# Altium footprint library TYCO THD.PcbLib: 146 footprints (part 6 of 11) (continued)
## TYCO_280612-2 [mm] "8 Positions, Pitch 3.96mm, Single Row Vertical Shrouded Header"
height 17
pads (8):
  round 2.1 hole 1.4: 1(-13.86,0) 2(-9.9,0) 3(-5.94,0) 4(-1.98,0) 5(1.98,0) 6(5.94,0) 7(9.9,0) 8(13.86,0)
Top Overlay:
  lines w0.2: -15,-4.775 -15,-0.896 ; -15,-3.775 -15.5,-3.775 -15.5,-4.775 15.5,-4.775 15.5,-3.775 15,-3.775 ; -15,-3.302 -12.725,-3.302 -12.725,-4.14 -11.049,-4.14 -11.049,-3.302 -8.763,-3.302 -8.763,-4.14 -7.087,-4.14 -7.087,-3.302 -4.801,-3.302 -4.801,-4.14 -3.124,-4.14 -3.124,-3.302 -0.838,-3.302 -0.838,-4.14 0.838,-4.14 0.838,-3.302 3.124,-3.302 3.124,-4.14 4.801,-4.14 4.801,-3.302 7.087,-3.302 7.087,-4.14 8.763,-4.14 8.763,-3.302 11.049,-3.302 11.049,-4.14 12.725,-4.14 12.725,-3.302 15,-3.302 ; -15,0.896 -15,4.14 ; -15,2.14 -15.5,2.14 -15.5,4.14 15.5,4.14 15.5,2.14 15,2.14 ; -15,3.268 15,3.268 ; -12.725,-3.632 -11.049,-3.632 ; -8.763,-3.632 -7.087,-3.632 ; -4.801,-3.632 -3.124,-3.632 ; -0.838,-3.632 0.838,-3.632 ; 3.124,-3.632 4.801,-3.632 ; 7.087,-3.632 8.763,-3.632 ; 11.049,-3.632 12.725,-3.632 ; 15,-4.775 15,-0.896 ; 15,0.896 15,4.14
  text "1" at -14.075,-6.55 h1.2
Mechanical 8:
  lines w0.1: -14.36,0 -13.86,0 ; -13.86,-0.5 -13.86,0 ; -13.86,0.5 -13.86,0 ; -13.36,0 -13.86,0 ; -10.4,0 -9.9,0 ; -9.9,-0.5 -9.9,0 ; -9.9,0.5 -9.9,0 ; -9.4,0 -9.9,0 ; -6.44,0 -5.94,0 ; -5.94,-0.5 -5.94,0 ; -5.94,0.5 -5.94,0 ; -5.44,0 -5.94,0 ; -2.48,0 -1.98,0 ; -1.98,-0.5 -1.98,0 ; -1.98,0.5 -1.98,0 ; -1.48,0 -1.98,0 ; -0.5,0 0,0 ; 0,-0.5 0,0 ; 0,0.5 0,0 ; 0.5,0 0,0 ; 1.48,0 1.98,0 ; 1.98,-0.5 1.98,0 ; 1.98,0.5 1.98,0 ; 2.48,0 1.98,0 ; 5.44,0 5.94,0 ; 5.94,-0.5 5.94,0 ; 5.94,0.5 5.94,0 ; 6.44,0 5.94,0 ; 9.4,0 9.9,0 ; 9.9,-0.5 9.9,0 ; 9.9,0.5 9.9,0 ; 10.4,0 9.9,0 ; 13.36,0 13.86,0 ; 13.86,-0.5 13.86,0 ; 13.86,0.5 13.86,0 ; 14.36,0 13.86,0
Mechanical 14:
  lines w0.1: -15,-4.775 -15,4.14 -15,3.268 15,3.268 15,4.14 15,-4.775 ; -15,-3.775 -15.5,-3.775 -15.5,-4.775 15.5,-4.775 15.5,-3.775 15,-3.775 ; -15,-3.302 -12.725,-3.302 -12.725,-4.14 -11.049,-4.14 -11.049,-3.302 -8.763,-3.302 -8.763,-4.14 -7.087,-4.14 -7.087,-3.302 -4.801,-3.302 -4.801,-4.14 -3.124,-4.14 -3.124,-3.302 -0.838,-3.302 -0.838,-4.14 0.838,-4.14 0.838,-3.302 3.124,-3.302 3.124,-4.14 4.801,-4.14 4.801,-3.302 7.087,-3.302 7.087,-4.14 8.763,-4.14 8.763,-3.302 11.049,-3.302 11.049,-4.14 12.725,-4.14 12.725,-3.302 15,-3.302 ; -15,2.14 -15.5,2.14 -15.5,4.14 15.5,4.14 15.5,2.14 15,2.14 ; -12.725,-3.632 -11.049,-3.632 ; -8.763,-3.632 -7.087,-3.632 ; -4.801,-3.632 -3.124,-3.632 ; -0.838,-3.632 0.838,-3.632 ; 3.124,-3.632 4.801,-3.632 ; 7.087,-3.632 8.763,-3.632 ; 11.049,-3.632 12.725,-3.632 ; -14.254,-0.787 -14.254,0.787 -13.466,0.787 -13.466,-0.787 -14.254,-0.787 ; -10.294,-0.787 -10.294,0.787 -9.506,0.787 -9.506,-0.787 -10.294,-0.787 ; -6.334,-0.787 -6.334,0.787 -5.546,0.787 -5.546,-0.787 -6.334,-0.787 ; -2.374,-0.787 -2.374,0.787 -1.586,0.787 -1.586,-0.787 -2.374,-0.787 ; 1.586,-0.787 1.586,0.787 2.374,0.787 2.374,-0.787 1.586,-0.787 ; 5.546,-0.787 5.546,0.787 6.334,0.787 6.334,-0.787 5.546,-0.787 ; 9.506,-0.787 9.506,0.787 10.294,0.787 10.294,-0.787 9.506,-0.787 ; 13.466,-0.787 13.466,0.787 14.254,0.787 14.254,-0.787 13.466,-0.787
  text "1" at -14.095,-2.8 h1.2
  text "8" at 13.468,-2.8 h1.2
3D body "TYCO_280612-2.stp": height 17.02, standoff -3.3, extent -15.5,-4.775 15.5,4.14

## TYCO_282836-4 [mm] "15.5A, 300V, Terminal Block, Pitch 5mm, 4 Positions, Screw Connection"
height 10
pads (4):
  round 1.9 hole 1.2: 1(-7.5,0) 2(-2.5,0) 3(2.5,0) 4(7.5,0)
Top Overlay:
  circle w0.2: c7.5,0 r1.75
  circle w0.2: c2.5,0 r1.75
  circle w0.2: c-2.5,0 r1.75
  circle w0.2: c-7.5,0 r1.75
  lines w0.2: -10,-3.4 10,-3.4 ; -10,-3.3 -10.6,-3.5 -10.6,-2.6 -10,-2.8 ; -10,-2.6 10,-2.6 ; -9.215,-0.35 -8.752,-0.35 ; -9.215,0.35 -8.752,0.35 ; -8.4,4.1 -8.4,3.4 -6.6,3.4 -6.6,4.1 ; -6.248,-0.35 -5.785,-0.35 ; -6.248,0.35 -5.785,0.35 ; -3.96,-0.965 -3.633,-0.638 ; -3.465,-1.46 -3.138,-1.133 ; -3.4,4.1 -3.4,3.4 -1.6,3.4 -1.6,4.1 ; -1.862,1.133 -1.535,1.46 ; -1.367,0.638 -1.04,0.965 ; 1.04,0.965 1.367,0.638 ; 1.535,1.46 1.862,1.133 ; 1.6,4.1 1.6,3.4 3.4,3.4 3.4,4.1 ; 3.138,-1.133 3.465,-1.46 ; 3.633,-0.638 3.96,-0.965 ; 6.04,-0.965 6.367,-0.638 ; 6.535,-1.46 6.862,-1.133 ; 6.6,4.1 6.6,3.4 8.4,3.4 8.4,4.059 ; 8.138,1.133 8.465,1.46 ; 8.633,0.638 8.96,0.965 ; -10,-4.1 -10,4.1 10,4.1 10,-4.1 -10,-4.1
  text "1" at -7.75,-5.925 h1.2
Mechanical 8:
  lines w0.1: -8,0 -7.5,0 ; -7.5,-0.5 -7.5,0 ; -7.5,0.5 -7.5,0 ; -7,0 -7.5,0 ; -3,0 -2.5,0 ; -2.5,-0.5 -2.5,0 ; -2.5,0.5 -2.5,0 ; -2,0 -2.5,0 ; -0.5,0 0,0 ; 0,-0.5 0,0 ; 0,0.5 0,0 ; 0.5,0 0,0 ; 2,0 2.5,0 ; 2.5,-0.5 2.5,0 ; 2.5,0.5 2.5,0 ; 3,0 2.5,0 ; 7,0 7.5,0 ; 7.5,-0.5 7.5,0 ; 7.5,0.5 7.5,0 ; 8,0 7.5,0
Mechanical 14:
  circle w0.1: c7.5,0 r1.75
  circle w0.1: c2.5,0 r1.75
  circle w0.1: c-2.5,0 r1.75
  circle w0.1: c-7.5,0 r1.75
  lines w0.1: -10,-3.4 10,-3.4 ; -10,-3.3 -10.6,-3.5 -10.6,-2.6 -10,-2.8 ; -10,-2.6 10,-2.6 ; -9.215,-0.35 -5.785,-0.35 ; -9.215,0.35 -5.785,0.35 ; -8.4,4.1 -8.4,3.4 -6.6,3.4 -6.6,4.1 ; -3.96,-0.965 -1.535,1.46 ; -3.465,-1.46 -1.04,0.965 ; -3.4,4.1 -3.4,3.4 -1.6,3.4 -1.6,4.1 ; 1.04,0.965 3.465,-1.46 ; 1.535,1.46 3.96,-0.965 ; 1.6,4.1 1.6,3.4 3.4,3.4 3.4,4.1 ; 6.04,-0.965 8.465,1.46 ; 6.535,-1.46 8.96,0.965 ; 6.6,4.1 6.6,3.4 8.4,3.4 8.4,4.059 ; -10,-4.1 -10,4.1 10,4.1 10,-4.1 -10,-4.1
  text "1" at -9.45,1.675 h1.2
3D body "TYCO_282836-4.stp": height 10, standoff -3.5, extent -10.6,-4.1 10,4.1

## TYCO_284516-3 [mm] "3 Positions, Pitch 3.5mm, Straight Header with Threaded Flange"
height 9.4
pads (3):
  round 1.9 hole 1.2: 1(-3.5,0) 2(0,0) 3(3.5,0)
Top Overlay:
  circle w0.2: c-7.8,0 r1.5
  circle w0.2: c-7.8,0 r1.3
  circle w0.2: c7.8,0 r1.3
  circle w0.2: c7.8,0 r1.5
  lines w0.2: -10.4,-3 10.4,-3 10.4,4.25 -10.4,4.25 -10.4,-3 ; -5.05,-2.25 -5.05,2.05 -4.4,2.05 ccw(c-4.4,2.25) -4.2,2.25 -4.2,2.5 ccw(c-4.4,2.5) -4.4,2.7 -4.75,2.7 -4.75,3.35 -2.25,3.35 -2.25,2.7 -2.6,2.7 ccw(c-2.6,2.5) -2.8,2.5 -2.8,2.25 ccw(c-2.6,2.25) -2.6,2.05 -1.95,2.05 -1.95,-2.25 -2.583,-2.25 ccw(c-3.5,-3.5) -4.417,-2.25 -5.05,-2.25 ; -1.55,-2.25 -1.55,2.05 -0.9,2.05 ccw(c-0.9,2.25) -0.7,2.25 -0.7,2.5 ccw(c-0.9,2.5) -0.9,2.7 -1.25,2.7 -1.25,3.35 1.25,3.35 1.25,2.7 0.9,2.7 ccw(c0.9,2.5) 0.7,2.5 0.7,2.25 ccw(c0.9,2.25) 0.9,2.05 1.55,2.05 1.55,-2.25 0.917,-2.25 ccw(c0,-3.5) -0.917,-2.25 -1.55,-2.25 ; 1.95,-2.25 1.95,2.05 2.6,2.05 ccw(c2.6,2.25) 2.8,2.25 2.8,2.5 ccw(c2.6,2.5) 2.6,2.7 2.25,2.7 2.25,3.35 4.75,3.35 4.75,2.7 4.4,2.7 ccw(c4.4,2.5) 4.2,2.5 4.2,2.25 ccw(c4.4,2.25) 4.4,2.05 5.05,2.05 5.05,-2.25 4.417,-2.25 ccw(c3.5,-3.5) 2.583,-2.25 1.95,-2.25
  text "1" at -3.63,-4.935 h1.2
Mechanical 8:
  lines w0.1: -4,0 -3.5,0 ; -3.5,-0.5 -3.5,0 ; -3.5,0.5 -3.5,0 ; -3,0 -3.5,0 ; -0.5,0 0,0 ; 0,-0.5 0,0 ; 0,0.5 0,0 ; 0.5,0 0,0 ; 3,0 3.5,0 ; 3.5,-0.5 3.5,0 ; 3.5,0.5 3.5,0 ; 4,0 3.5,0
Mechanical 14:
  circle w0.1: c-3.5,0 r1.1
  circle w0.1: c-3.5,0 r0.9
  circle w0.1: c0,0 r1.1
  circle w0.1: c0,0 r0.9
  circle w0.1: c3.5,0 r1.1
  circle w0.1: c3.5,0 r0.9
  circle w0.1: c-7.8,0 r1.5
  circle w0.1: c-7.8,0 r1.3
  circle w0.1: c7.8,0 r1.3
  circle w0.1: c7.8,0 r1.5
  lines w0.1: -10.4,-3 10.4,-3 10.4,4.25 -10.4,4.25 -10.4,-3 ; -5.05,-2.25 -5.05,2.05 -4.4,2.05 ccw(c-4.4,2.25) -4.2,2.25 -4.2,2.5 ccw(c-4.4,2.5) -4.4,2.7 -4.75,2.7 -4.75,3.35 -2.25,3.35 -2.25,2.7 -2.6,2.7 ccw(c-2.6,2.5) -2.8,2.5 -2.8,2.25 ccw(c-2.6,2.25) -2.6,2.05 -1.95,2.05 -1.95,-2.25 -2.583,-2.25 ccw(c-3.5,-3.5) -4.417,-2.25 -5.05,-2.25 ; -3.9,-0.4 -3.1,-0.4 -3.1,0.4 -3.9,0.4 -3.9,-0.4 ; -1.55,-2.25 -1.55,2.05 -0.9,2.05 ccw(c-0.9,2.25) -0.7,2.25 -0.7,2.5 ccw(c-0.9,2.5) -0.9,2.7 -1.25,2.7 -1.25,3.35 1.25,3.35 1.25,2.7 0.9,2.7 ccw(c0.9,2.5) 0.7,2.5 0.7,2.25 ccw(c0.9,2.25) 0.9,2.05 1.55,2.05 1.55,-2.25 0.917,-2.25 ccw(c0,-3.5) -0.917,-2.25 -1.55,-2.25 ; -0.4,-0.4 0.4,-0.4 0.4,0.4 -0.4,0.4 -0.4,-0.4 ; 1.95,-2.25 1.95,2.05 2.6,2.05 ccw(c2.6,2.25) 2.8,2.25 2.8,2.5 ccw(c2.6,2.5) 2.6,2.7 2.25,2.7 2.25,3.35 4.75,3.35 4.75,2.7 4.4,2.7 ccw(c4.4,2.5) 4.2,2.5 4.2,2.25 ccw(c4.4,2.25) 4.4,2.05 5.05,2.05 5.05,-2.25 4.417,-2.25 ccw(c3.5,-3.5) 2.583,-2.25 1.95,-2.25 ; 3.1,-0.4 3.9,-0.4 3.9,0.4 3.1,0.4 3.1,-0.4
  text "1" at -3.63,-4.935 h1.2
3D body "TYCO_284516-3.stp": height 9.2, standoff -3.4, extent -10.4,-3 10.4,4.25

## TYCO_284516-8 [mm] "8 Positions, Pitch 3.5mm, Straight Header with Threaded Flange"
height 9.4
pads (8):
  round 1.9 hole 1.2: 1(-12.25,0) 2(-8.75,0) 3(-5.25,0) 4(-1.75,0) 5(1.75,0) 6(5.25,0) 7(8.75,0) 8(12.25,0)
Top Overlay:
  drawing of 152 lines, arcs and shapes, not listed
  text "1" at -12.38,-4.935 h1.2
Mechanical 8:
  lines w0.1: -12.75,0 -12.25,0 ; -12.25,-0.5 -12.25,0 ; -12.25,0.5 -12.25,0 ; -11.75,0 -12.25,0 ; -9.25,0 -8.75,0 ; -8.75,-0.5 -8.75,0 ; -8.75,0.5 -8.75,0 ; -8.25,0 -8.75,0 ; -5.75,0 -5.25,0 ; -5.25,-0.5 -5.25,0 ; -5.25,0.5 -5.25,0 ; -4.75,0 -5.25,0 ; -2.25,0 -1.75,0 ; -1.75,-0.5 -1.75,0 ; -1.75,0.5 -1.75,0 ; -1.25,0 -1.75,0 ; -0.5,0 0,0 ; 0,-0.5 0,0 ; 0,0.5 0,0 ; 0.5,0 0,0 ; 1.25,0 1.75,0 ; 1.75,-0.5 1.75,0 ; 1.75,0.5 1.75,0 ; 2.25,0 1.75,0 ; 4.75,0 5.25,0 ; 5.25,-0.5 5.25,0 ; 5.25,0.5 5.25,0 ; 5.75,0 5.25,0 ; 8.25,0 8.75,0 ; 8.75,-0.5 8.75,0 ; 8.75,0.5 8.75,0 ; 9.25,0 8.75,0 ; 11.75,0 12.25,0 ; 12.25,-0.5 12.25,0 ; 12.25,0.5 12.25,0 ; 12.75,0 12.25,0
Mechanical 14:
  drawing of 200 lines, arcs and shapes, not listed
3D body "TYCO_284516-8.stp": height 9.2, standoff -3.4, extent -19.15,-3 19.15,4.25

## TYCO_292303-1 [mm] "4 Positions, Right Angle, USB Type A Receptacle"
height 7.65
pads (6):
  round 1.6 hole 0.9: 1(-3.5,0) 2(-1,0) 3(1,0) 4(3.5,0)
  round 3 hole 2.3: 5(-6.57,-2.71) 5(6.57,-2.71)
Top Overlay:
  lines w0.2: -6.565,-4.71 -6.565,-12.37 ; -6.565,-0.71 -6.565,1.01 -4.318,1.01 ; -6.247,-12.37 cw(c-6.867,-12.37) -6.867,-12.99 -7.312,-12.99 -7.312,-12.672 -6.867,-12.672 ccw(c-6.867,-12.37) -6.565,-12.37 ; -5.607,-12.672 5.607,-12.672 ; -5.607,-12.37 -5.607,-12.99 5.607,-12.99 5.607,-12.37 ; -3.846,-11.624 -2.154,-11.624 ; -3.422,-11.196 -2.578,-11.196 ; 2.154,-11.624 3.846,-11.624 ; 2.578,-11.196 3.422,-11.196 ; 4.318,1.01 6.565,1.01 6.565,-0.71 ; 6.247,-12.37 ccw(c6.867,-12.37) 6.867,-12.99 7.312,-12.99 7.312,-12.672 6.867,-12.672 cw(c6.867,-12.37) 6.565,-12.37 ; 6.565,-4.71 6.565,-12.37 ; -6.565,-12.37 6.565,-12.37 ; -4.745,-5.082 cw(c-4.497,-5.048) -4.249,-5.015 -3.392,-11.421 -2.608,-11.421 -1.751,-5.015 cw(c-1.503,-5.048) -1.255,-5.082 -2.104,-11.426 cw(c-3,-11.306) -3.896,-11.426 -4.745,-5.082 ; 1.255,-5.082 cw(c1.503,-5.048) 1.751,-5.015 2.608,-11.421 3.392,-11.421 4.249,-5.015 cw(c4.497,-5.048) 4.745,-5.082 3.896,-11.426 cw(c3,-11.306) 2.104,-11.426 1.255,-5.082
Mechanical 8:
  circle w0.1: c-6.57,-2.71 r1.5
  circle w0.1: c6.565,-2.71 r1.5
  circle w0.1: c-1,0 r0.8
  circle w0.1: c1,0 r0.8
  circle w0.1: c3.5,0 r0.8
  circle w0.1: c-3.5,0 r0.8
  circle w0.1: c3.5,0 r0.45
  circle w0.1: c1,0 r0.45
  circle w0.1: c-1,0 r0.45
  circle w0.1: c-3.5,0 r0.45
  circle w0.1: c6.57,-2.71 r1.15
  circle w0.1: c-6.57,-2.71 r1.15
  lines w0.1: -7.07,-2.71 -6.57,-2.71 ; -6.57,-3.21 -6.57,-2.71 ; -6.57,-2.21 -6.57,-2.71 ; -6.07,-2.71 -6.57,-2.71 ; -4,0 -3.5,0 ; -3.5,-0.5 -3.5,0 ; -3.5,0.5 -3.5,0 ; -3,0 -3.5,0 ; -1.5,0 -1,0 ; -1,-0.5 -1,0 ; -1,0.5 -1,0 ; -0.5,0 -1,0 ; -0.354,-0.354 0,0 ; -0.354,0.354 0,0 ; 0.354,-0.354 0,0 ; 0.354,0.354 0,0 ; 0.5,0 1,0 ; 1,-0.5 1,0 ; 1,0.5 1,0 ; 1.5,0 1,0 ; 3,0 3.5,0 ; 3.5,-0.5 3.5,0 ; 3.5,0.5 3.5,0 ; 4,0 3.5,0 ; 6.07,-2.71 6.57,-2.71 ; 6.57,-3.21 6.57,-2.71 ; 6.57,-2.21 6.57,-2.71 ; 7.07,-2.71 6.57,-2.71
Mechanical 14:
  lines w0.1: -6.565,-3.75 ccw(c-6.665,-3.75) -6.649,-3.652 -8.033,-3.427 cw(c-8.017,-3.328) -8.117,-3.328 -8.117,-2.092 cw(c-8.017,-2.092) -8.033,-1.993 -6.649,-1.768 ccw(c-6.665,-1.67) -6.565,-1.67 ; -6.565,-1.364 -6.68,-1.11 -6.68,-0.61 -6.565,-0.61 ; -6.247,-12.37 cw(c-6.867,-12.37) -6.867,-12.99 -7.312,-12.99 -7.312,-12.672 -6.867,-12.672 ccw(c-6.867,-12.37) -6.565,-12.37 ; -5.607,-12.672 5.607,-12.672 ; -5.607,-12.37 -5.607,-12.99 5.607,-12.99 5.607,-12.37 ; -3.846,-11.624 -2.154,-11.624 ; -3.422,-11.196 -2.578,-11.196 ; 2.154,-11.624 3.846,-11.624 ; 2.578,-11.196 3.422,-11.196 ; 6.247,-12.37 ccw(c6.867,-12.37) 6.867,-12.99 7.312,-12.99 7.312,-12.672 6.867,-12.672 cw(c6.867,-12.37) 6.565,-12.37 ; 6.565,-3.75 cw(c6.665,-3.75) 6.649,-3.652 8.033,-3.427 ccw(c8.017,-3.328) 8.117,-3.328 8.117,-2.092 ccw(c8.017,-2.092) 8.033,-1.993 6.649,-1.768 cw(c6.665,-1.67) 6.565,-1.67 ; 6.565,-1.364 6.68,-1.11 6.68,-0.61 6.565,-0.61 ; -6.565,-12.37 6.565,-12.37 ; -6.565,-12.37 -6.565,1.01 6.565,1.01 6.565,-12.37 ; -4.745,-5.082 cw(c-4.497,-5.048) -4.249,-5.015 -3.392,-11.421 -2.608,-11.421 -1.751,-5.015 cw(c-1.503,-5.048) -1.255,-5.082 -2.104,-11.426 cw(c-3,-11.306) -3.896,-11.426 -4.745,-5.082 ; 1.255,-5.082 cw(c1.503,-5.048) 1.751,-5.015 2.608,-11.421 3.392,-11.421 4.249,-5.015 cw(c4.497,-5.048) 4.745,-5.082 3.896,-11.426 cw(c3,-11.306) 2.104,-11.426 1.255,-5.082
3D body "TYCO_292303-1.stp": height 7.66, standoff -3.61, extent -8.115,-12.99 8.117,1.01

## TYCO_292304-1 [mm] "Thru Hole, Right Angle, 4 Position, Type B, USB Receptacle"
height 11.5
pads (6):
  round 1.7 hole 1: 1(1.25,1) 2(-1.25,1) 3(-1.25,-1) 4(1.25,-1)
  round 3 hole 2.3: 5(-6.02,-3.71) 5(6.02,-3.71)
Top Overlay:
  circle w0.3: c1.257,2.427 r0.15
  lines w0.2: -6.13,-1.913 -6.13,1.72 -2.147,1.72 ; -6.018,-5.51 -6.018,-13.98 6.018,-13.98 6.018,-5.51 ; -5.6,-1.96 -5.6,1.72 ; -4.544,-2.68 4.544,-2.68 ; -1.25,-13.98 -1.25,-12.832 cw(c-1,-12.83) -0.75,-12.832 -0.75,-13.98 ; -1.25,-13.662 -0.75,-13.662 ; -1.25,-13.568 -0.75,-13.568 ; -0.75,-13.342 0.75,-13.342 ; 0.75,-13.98 0.75,-12.832 cw(c1,-12.83) 1.25,-12.832 1.25,-13.98 ; 0.75,-13.662 1.25,-13.662 ; 0.75,-13.568 1.25,-13.568 ; 2.147,1.72 6.13,1.72 6.13,-1.913 ; 5.6,-1.96 5.6,1.72
Mechanical 8:
  lines w0.1: -7.02,-3.71 -6.02,-3.71 ; -6.02,-4.71 -6.02,-3.71 ; -6.02,-2.71 -6.02,-3.71 ; -5.02,-3.71 -6.02,-3.71 ; -2.25,-1 -1.25,-1 ; -2.25,1 -1.25,1 ; -1.25,-2 -1.25,-1 ; -1.25,2 -1.25,1 ; -1,0 0,0 ; -0.25,-1 -1.25,-1 ; -0.25,1 -1.25,1 ; 0,-1 0,0 ; 0,1 0,0 ; 0.25,-1 1.25,-1 ; 0.25,1 1.25,1 ; 1,0 0,0 ; 1.25,-2 1.25,-1 ; 1.25,2 1.25,1 ; 2.25,-1 1.25,-1 ; 2.25,1 1.25,1 ; 5.02,-3.71 6.02,-3.71 ; -1.25,-1 -1.25,0 -1.25,1 ; 1.25,-1 1.25,0 1.25,1 ; 6.02,-4.71 6.02,-3.71 ; 6.02,-4.71 6.02,-3.71 ; 6.02,-4.71 6.02,-3.71 ; 6.02,-3.71 6.02,-2.71 ; 6.02,-3.71 7.02,-3.71 ; 6.02,-3.71 6.02,-2.71 ; 6.02,-3.71 7.02,-3.71 ; 6.02,-3.71 6.02,-2.71 ; 6.02,-3.71 7.02,-3.71
Mechanical 14:
  lines w0.1: -6.13,-4.608 -6.13,-4.81 -6.018,-5.057 ; -6.018,-4.619 -7.096,-4.511 ; -6.018,-2.781 -7.096,-2.889 ; -5.6,-2.68 -5.6,1.72 ; -5.6,-2.28 -6.13,-2.28 -6.13,1.72 6.13,1.72 6.13,-2.28 5.6,-2.28 ; -1.25,-13.98 -1.25,-12.832 cw(c-1,-12.83) -0.75,-12.832 -0.75,-13.98 ; -1.25,-13.662 -0.75,-13.662 ; -1.25,-13.568 -0.75,-13.568 ; -0.75,-13.342 0.75,-13.342 ; 0.75,-13.98 0.75,-12.832 cw(c1,-12.83) 1.25,-12.832 1.25,-13.98 ; 0.75,-13.662 1.25,-13.662 ; 0.75,-13.568 1.25,-13.568 ; 5.6,-2.68 5.6,1.72 ; 6.018,-5.057 6.13,-4.81 6.13,-4.608 ; 6.018,-4.619 7.096,-4.511 ; 6.018,-2.781 7.096,-2.889 ; -7.096,-4.511 -7.096,-2.889 ; -7.096,-4.511 -7.162,-4.5 -7.192,-4.486 -7.195,-4.479 -7.195,-2.921 -7.192,-2.914 -7.162,-2.9 -7.096,-2.889 ; 7.096,-4.511 7.096,-2.889 ; 7.096,-4.511 7.162,-4.5 7.192,-4.486 7.195,-4.479 7.195,-2.921 7.192,-2.914 7.162,-2.9 7.096,-2.889 ; -6.018,-13.98 -6.018,-2.68 6.018,-2.68 6.018,-13.98 -6.018,-13.98
3D body "TYCO_292304-1.stp": height 11.5, standoff -3.93, extent -7.194,-13.98 7.195,1.72

## TYCO_350209-1 [mm] "2 Circuits In-Line - 200\" Centerline, Commercial MATE-N-LOK Header"
height 10.29
pads (2):
  round 2.5 hole 1.8: 1(2.54,0) 2(-2.54,0)
Top Overlay:
  circle w0.2: c2.54,0 r1.587
  circle w0.2: c-2.54,0 r1.587
  lines w0.2: -6.541,-1.651 -7.62,-1.651 -7.62,1.651 -6.541,1.651 ; -5.683,-2.921 -6.541,-2.921 ccw(c-5.271,-2.921) -5.271,-4.191 -5.27,-3.143 ; -5.271,2.127 -5.271,4.191 ; -4.667,2.921 -6.541,2.921 ; -3.391,-3.143 -3.391,-2.813 -1.93,-2.813 -1.93,-3.143 ; -3.391,3.143 -3.391,2.813 -1.93,2.813 -1.93,3.143 ; -1.568,-4.191 -1.568,-5.461 -0.406,-5.461 -0.406,-4.191 ; 1.689,-3.143 1.689,-2.813 3.15,-2.813 3.15,-3.143 ; 1.689,3.143 1.689,2.813 3.15,2.813 3.15,3.143 ; 3.404,-4.191 3.404,-5.461 4.674,-5.461 4.674,-4.191 ; 4.667,2.921 6.541,2.921 ; 5.27,-3.143 5.271,-4.191 ; 5.271,2.127 5.271,4.191 ; 5.683,-2.921 6.541,-2.921 ; 6.541,-1.651 7.62,-1.651 7.62,1.651 6.541,1.651 ; -6.541,2.921 cw(c-5.271,2.921) -5.271,4.191 ; -6.541,2.921 -6.541,-5.461 -5.378,-5.461 -5.378,-4.191 5.271,-4.191 ; -5.271,4.191 5.271,4.191 ; 5.271,-4.191 ccw(c5.271,-2.921) 6.541,-2.921 ; 5.271,4.191 cw(c5.271,2.921) 6.541,2.921 ; 6.541,-2.921 6.541,2.921 ; -5.683,-3.143 5.683,-3.143 5.683,2.127 4.667,2.127 4.667,3.143 -4.667,3.143 -4.667,2.127 -5.683,2.127 -5.683,-3.143
  text "2" at -2.24,-5.525 h1.2
  text "1" at 2.79,-5.1 h1.2
Mechanical 8:
  lines w0.1: -1,0 0,0 ; 0,-1 0,0 ; 0,1 0,0 ; 1,0 0,0
Mechanical 14:
  circle w0.1: c2.54,0 r1.587
  circle w0.1: c-2.54,0 r1.587
  circle w0.1: c-2.54,0 r1.048
  circle w0.1: c2.54,0 r1.048
  lines w0.1: -6.541,-1.651 -7.62,-1.651 -7.62,1.651 -6.541,1.651 ; -5.683,-2.921 -6.541,-2.921 ccw(c-5.271,-2.921) -5.271,-4.191 -5.27,-3.143 ; -5.271,2.127 -5.271,4.191 ; -4.667,2.921 -6.541,2.921 ; -3.391,-3.143 -3.391,-2.813 -1.93,-2.813 -1.93,-3.143 ; -3.391,3.143 -3.391,2.813 -1.93,2.813 -1.93,3.143 ; -1.568,-4.191 -1.568,-5.461 -0.406,-5.461 -0.406,-4.191 ; 1.689,-3.143 1.689,-2.813 3.15,-2.813 3.15,-3.143 ; 1.689,3.143 1.689,2.813 3.15,2.813 3.15,3.143 ; 3.404,-4.191 3.404,-5.461 4.674,-5.461 4.674,-4.191 ; 4.667,2.921 6.541,2.921 ; 5.27,-3.143 5.271,-4.191 ; 5.271,2.127 5.271,4.191 ; 5.683,-2.921 6.541,-2.921 ; 6.541,-1.651 7.62,-1.651 7.62,1.651 6.541,1.651 ; -6.541,2.921 cw(c-5.271,2.921) -5.271,4.191 ; -6.541,2.921 -6.541,-5.461 -5.378,-5.461 -5.378,-4.191 5.271,-4.191 ; -5.271,4.191 5.271,4.191 ; 5.271,-4.191 ccw(c5.271,-2.921) 6.541,-2.921 ; 5.271,4.191 cw(c5.271,2.921) 6.541,2.921 ; 6.541,-2.921 6.541,2.921 ; -5.683,-3.143 5.683,-3.143 5.683,2.127 4.667,2.127 4.667,3.143 -4.667,3.143 -4.667,2.127 -5.683,2.127 -5.683,-3.143
  text "2" at -2.24,-5.525 h1.2
  text "1" at 2.79,-5.1 h1.2
3D body "TYCO_350209-1.stp": height 10.29, standoff -3.43, extent -7.62,-5.461 7.62,4.191

## TYCO_350211-1 [mm] "4 Circuits In-Line - 200\" Centerline, Commercial MATE-N-LOK Header"
height 10.29
pads (4):
  round 2.5 hole 1.8: 1(7.62,0) 2(2.54,0) 3(-2.54,0) 4(-7.62,0)
Top Overlay:
  circle w0.2: c-7.62,0 r1.587
  circle w0.2: c-2.54,0 r1.587
  circle w0.2: c2.54,0 r1.587
  circle w0.2: c7.62,0 r1.587
  lines w0.2: -11.652,-2.858 ccw(c-10.382,-2.858) -10.382,-4.128 ; -11.652,-1.651 -12.7,-1.651 -12.7,1.651 -11.652,1.651 ; -7.43,-3.207 -7.43,-2.826 -3.874,-2.826 -3.874,-3.207 ; -7.43,3.207 -7.43,2.826 -3.874,2.826 -3.874,3.207 ; -6.572,-4.128 -6.572,-5.398 -5.302,-5.398 -5.302,-4.128 ; -1.492,-4.128 -1.492,-5.398 -0.222,-5.398 -0.222,-4.128 ; 3.588,-4.128 3.588,-5.398 4.858,-5.398 4.858,-4.128 ; 3.797,-3.207 3.797,-2.826 7.353,-2.826 7.353,-3.207 ; 3.797,3.207 3.797,2.826 7.353,2.826 7.353,3.207 ; 7.537,-3.175 7.734,-3.175 ; 8.668,-4.128 8.668,-5.398 9.938,-5.398 9.938,-4.128 ; 11.652,-1.651 12.7,-1.651 12.7,1.651 11.652,1.651 ; -10.382,-4.128 -10.382,-5.398 -11.652,-5.398 -11.652,2.858 cw(c-10.382,2.858) -10.382,4.128 10.382,4.128 cw(c10.382,2.858) 11.652,2.858 11.652,-2.858 cw(c10.382,-2.858) 10.382,-4.128 -10.382,-4.128 ; -10.605,-3.207 -10.605,1.429 -8.827,3.207 8.827,3.207 10.605,1.429 10.605,-3.207 -10.605,-3.207
  text "4" at -7.715,-5.58 h1.2
  text "3" at -2.415,-5.53 h1.2
  text "2" at 2.775,-5.525 h1.2
  text "1" at 7.7,-5.275 h1.2
Mechanical 8:
  lines w0.1: -8.62,0 -7.62,0 ; -7.62,-1 -7.62,0 ; -7.62,1 -7.62,0 ; -6.62,0 -7.62,0 ; -3.54,0 -2.54,0 ; -2.54,-1 -2.54,0 ; -2.54,1 -2.54,0 ; -1.54,0 -2.54,0 ; -1,0 0,0 ; 0,-1 0,0 ; 0,1 0,0 ; 1,0 0,0 ; 1.54,0 2.54,0 ; 2.54,-1 2.54,0 ; 2.54,1 2.54,0 ; 3.54,0 2.54,0 ; 6.62,0 7.62,0 ; 7.62,-1 7.62,0 ; 7.62,1 7.62,0 ; 8.62,0 7.62,0
Mechanical 14:
  circle w0.1: c-7.62,0 r1.048
  circle w0.1: c-7.62,0 r1.587
  circle w0.1: c-2.54,0 r1.048
  circle w0.1: c-2.54,0 r1.587
  circle w0.1: c2.54,0 r1.048
  circle w0.1: c2.54,0 r1.587
  circle w0.1: c7.62,0 r1.048
  circle w0.1: c7.62,0 r1.587
  lines w0.1: -11.652,-2.858 ccw(c-10.382,-2.858) -10.382,-4.128 ; -11.652,-1.651 -12.7,-1.651 -12.7,1.651 -11.652,1.651 ; -7.43,-3.207 -7.43,-2.826 -3.874,-2.826 -3.874,-3.207 ; -7.43,3.207 -7.43,2.826 -3.874,2.826 -3.874,3.207 ; -6.572,-4.128 -6.572,-5.398 -5.302,-5.398 -5.302,-4.128 ; -1.492,-4.128 -1.492,-5.398 -0.222,-5.398 -0.222,-4.128 ; 3.588,-4.128 3.588,-5.398 4.858,-5.398 4.858,-4.128 ; 3.797,-3.207 3.797,-2.826 7.353,-2.826 7.353,-3.207 ; 3.797,3.207 3.797,2.826 7.353,2.826 7.353,3.207 ; 7.537,-3.175 7.734,-3.175 ; 8.668,-4.128 8.668,-5.398 9.938,-5.398 9.938,-4.128 ; 11.652,-1.651 12.7,-1.651 12.7,1.651 11.652,1.651 ; -10.382,-4.128 -10.382,-5.398 -11.652,-5.398 -11.652,2.858 cw(c-10.382,2.858) -10.382,4.128 10.382,4.128 cw(c10.382,2.858) 11.652,2.858 11.652,-2.858 cw(c10.382,-2.858) 10.382,-4.128 -10.382,-4.128 ; -10.605,-3.207 -10.605,1.429 -8.827,3.207 8.827,3.207 10.605,1.429 10.605,-3.207 -10.605,-3.207
  text "4" at -7.715,-5.58 h1.2
  text "3" at -2.415,-5.53 h1.2
  text "2" at 2.775,-5.525 h1.2
  text "1" at 7.7,-5.275 h1.2
3D body "TYCO_350211-1.stp": height 10.29, standoff -3.43, extent -12.7,-5.397 12.7,4.128

## TYCO_350582-1 [mm] "2 Circuits In-Line - Universal MATE-N-LOK Connector"
height 14.73
pads (2):
  round 2.5 hole 1.8: 1(-3.175,0) 2(3.175,0)
Top Overlay:
  lines w0.2: -7.325,-1.27 -7.325,1.27 ; -6.985,-3.81 6.985,-3.81 ; -5.715,-3.81 -5.715,-5.08 -6.985,-5.08 -6.985,-1.27 -9.525,-1.27 -9.525,1.27 -6.985,1.27 -6.985,3.81 6.985,3.81 6.985,1.27 9.525,1.27 9.525,-1.27 6.985,-1.27 6.985,-5.08 5.715,-5.08 5.715,-3.81 ; -0.635,-3.81 -0.635,-5.08 0.635,-5.08 0.635,-3.81 ; 7.325,-1.27 7.325,1.27 ; -5.998,-2.823 -5.998,0 ; -5.998,-2.823 -5.779,-2.604 ; -5.998,-2.823 -0.352,-2.823 ; -5.998,0 cw(c-3.175,0) -0.352,0 ; -5.998,0 -5.779,0 ; -5.779,-2.604 -5.779,0 ; -5.779,-2.604 -0.572,-2.604 ; -5.779,0 cw(c-3.175,0) -0.572,0 ; -0.572,-2.604 -0.352,-2.823 ; -0.572,-2.604 -0.572,0 ; -0.572,0 -0.352,0 ; -0.352,-2.823 -0.352,0 ; 0.352,-2.823 5.998,-2.823 ; 0.352,-2.823 0.352,0 ; 0.352,-2.823 0.572,-2.604 ; 0.352,0 cw(c3.175,0) 5.998,0 ; 0.352,0 0.572,0 ; 0.572,-2.604 5.779,-2.604 ; 0.572,-2.604 0.572,0 ; 0.572,0 cw(c3.175,0) 5.779,0 ; 5.779,-2.604 5.998,-2.823 ; 5.779,-2.604 5.779,0 ; 5.779,0 5.998,0 ; 5.998,-2.823 5.998,0
  text "2" at 3.762,-5.21 h1.2
  text "1" at -2.746,-4.783 h1.2
Mechanical 8:
  lines w0.1: -3.675,0 -3.175,0 ; -3.175,-0.5 -3.175,0 ; -3.175,0.5 -3.175,0 ; -2.675,0 -3.175,0 ; -0.5,0 0,0 ; 0,-0.5 0,0 ; 0,0.5 0,0 ; 0.5,0 0,0 ; 2.675,0 3.175,0 ; 3.175,-0.5 3.175,0 ; 3.175,0.5 3.175,0 ; 3.675,0 3.175,0
Mechanical 14:
  circle w0.1: c3.175,0 r0.965
  circle w0.1: c-3.175,0 r0.965
  lines w0.1: -7.325,-1.27 -7.325,1.27 ; -6.985,-3.81 6.985,-3.81 ; -5.715,-3.81 -5.715,-5.08 -6.985,-5.08 -6.985,-1.27 -9.525,-1.27 -9.525,1.27 -6.985,1.27 -6.985,3.81 6.985,3.81 6.985,1.27 9.525,1.27 9.525,-1.27 6.985,-1.27 6.985,-5.08 5.715,-5.08 5.715,-3.81 ; -4.12,-0.222 -2.23,-0.222 ; -4.12,0.222 -2.23,0.222 ; -0.635,-3.81 -0.635,-5.08 0.635,-5.08 0.635,-3.81 ; 2.23,-0.222 4.12,-0.222 ; 2.23,0.222 4.12,0.222 ; 7.325,-1.27 7.325,1.27 ; -5.998,-2.823 -5.998,0 ; -5.998,-2.823 -5.779,-2.604 ; -5.998,-2.823 -0.352,-2.823 ; -5.998,0 cw(c-3.175,0) -0.352,0 ; -5.998,0 -5.779,0 ; -5.779,-2.604 -5.779,0 ; -5.779,-2.604 -0.572,-2.604 ; -5.779,0 cw(c-3.175,0) -0.572,0 ; -0.572,-2.604 -0.352,-2.823 ; -0.572,-2.604 -0.572,0 ; -0.572,0 -0.352,0 ; -0.352,-2.823 -0.352,0 ; 0.352,-2.823 5.998,-2.823 ; 0.352,-2.823 0.352,0 ; 0.352,-2.823 0.572,-2.604 ; 0.352,0 cw(c3.175,0) 5.998,0 ; 0.352,0 0.572,0 ; 0.572,-2.604 5.779,-2.604 ; 0.572,-2.604 0.572,0 ; 0.572,0 cw(c3.175,0) 5.779,0 ; 5.779,-2.604 5.998,-2.823 ; 5.779,-2.604 5.779,0 ; 5.779,0 5.998,0 ; 5.998,-2.823 5.998,0
  text "2" at 3.762,-5.21 h1.2
  text "1" at -2.746,-4.783 h1.2
3D body "TYCO_350582-1.stp": height 14.82, standoff -5.33, extent -9.525,-5.08 9.525,3.81